# Altium schematic symbol library SCHLIB.SchLib: 2608 symbols (part 1 of 20) (continued)
## CC-5pF-0402-50V-±0.1pF (continued)
CAP CER 5PF 50V C0G/NP0 0402; Manufacturer Part Number: GCM1555C1H5R0BA16D; Manufacturer: Murata Electronics; Tolerance: ±0.1pF; Temperature Coefficient: C0G; Object  Type: Part; Design Item ID: CC-5pF-0402-50V-±0.1pF; Series: GCM; Operating Temperature: -55°C ~ 125°C; Features: -; Ratings: AEC-Q200; Applications: Automotive; Failure Rate: -; Mounting Type: Surface Mount, MLCC; Size: 1.00mm x 0.50mm; Height: -; Thickness: 0.55mm; Category: Capacitor; Value: 5pF
footprint CC0402
pins: 1, 2

## CC-5pF-0402-50V-±1%
designator C?, comment Voltage - Rated: 50V  Package: 0402  (hidden comment: 5pF)
CAP CER 5PF 50V C0G/NP0 0402; Manufacturer Part Number: GCM1555C1H5R0FA16D; Manufacturer: Murata Electronics; Tolerance: ±1%; Temperature Coefficient: C0G; Object  Type: Part; Design Item ID: CC-5pF-0402-50V-±1%; Series: GCM; Operating Temperature: -55°C ~ 125°C; Features: -; Ratings: AEC-Q200; Applications: Automotive; Failure Rate: -; Mounting Type: Surface Mount, MLCC; Size: 1.00mm x 0.50mm; Height: -; Thickness: 0.55mm; Category: Capacitor; Value: 5pF
footprint CC0402
pins: 1, 2

## CC-6.8nF-0402-50V-±10%
designator C?, comment Voltage - Rated: 50V  Package: 0402  (hidden comment: 6.8nF)
CAP CER 6800PF 50V X7R 0402; Manufacturer Part Number: GCM155R71H682KA55D; Manufacturer: Murata Electronics; Tolerance: ±10%; Temperature Coefficient: C0G; Object  Type: Part; Design Item ID: CC-6.8nF-0402-50V-±10%; Series: GCM; Operating Temperature: -55°C ~ 125°C; Features: -; Ratings: AEC-Q200; Applications: Automotive; Failure Rate: -; Mounting Type: Surface Mount, MLCC; Size: 1.00mm x 0.50mm; Height: -; Thickness: 0.55mm; Category: Capacitor; Value: 6.8nF
footprint CC0402
pins: 1, 2

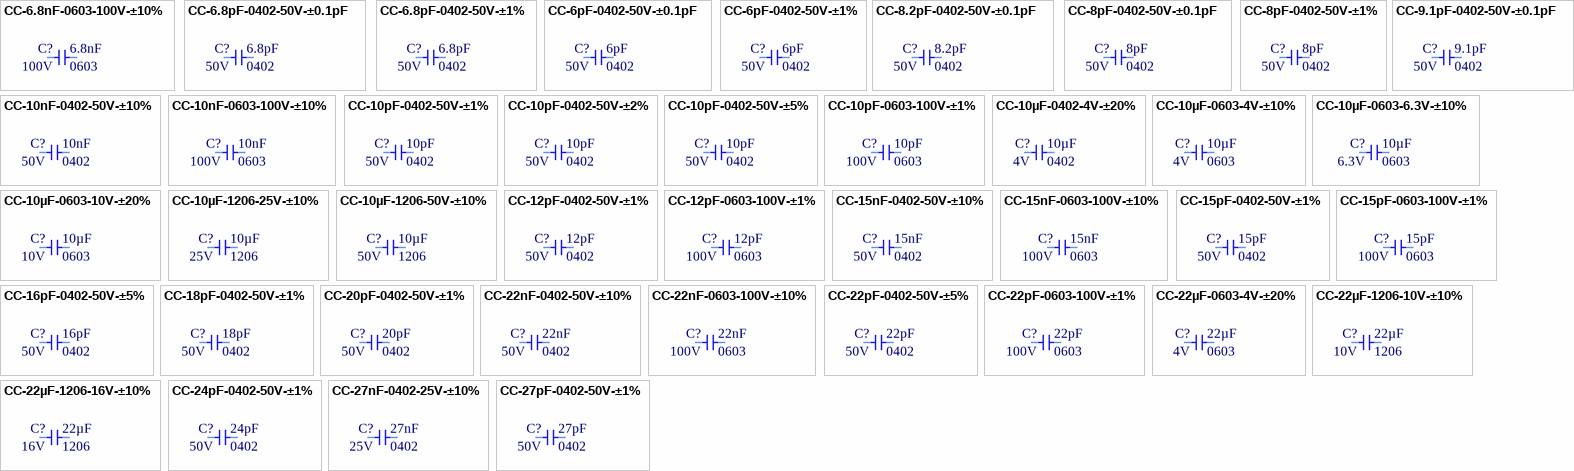
[diagram p2: symbols CC-6.8nF-0603-100V-±10% to CC-27pF-0402-50V-±1%]

## CC-6.8nF-0603-100V-±10%
designator C?, comment Voltage - Rated: 100V  Package: 0603  (hidden comment: 6.8nF)
CAP CER 6800PF 100V X7R 0603; Manufacturer Part Number: GCM188R72A682KA37D; Manufacturer: Murata Electronics; Tolerance: ±10%; Object  Type: Part; Design Item ID: CC-6.8nF-0603-100V-±10%; Series: GCM; Temperature Coefficient: X7R; Operating Temperature: -55°C ~ 125°C; Features: -; Ratings: AEC-Q200; Applications: Automotive; Failure Rate: -; Mounting Type: Surface Mount, MLCC; Size: 1.60mm x 0.80mm; Height: -; Thickness: 0.90mm; Category: Capacitor; Value: 6.8nF
footprint CC0603
pins: 1, 2

## CC-6.8pF-0402-50V-±0.1pF
designator C?, comment Voltage - Rated: 50V  Package: 0402  (hidden comment: 6.8pF)
CAP CER 6.8PF 50V C0G/NP0 0402; Manufacturer Part Number: GCM1555C1H6R8BA16D; Manufacturer: Murata Electronics; Tolerance: ±0.1pF; Temperature Coefficient: C0G; Object  Type: Part; Design Item ID: CC-6.8pF-0402-50V-±0.1pF; Series: GCM; Operating Temperature: -55°C ~ 125°C; Features: -; Ratings: AEC-Q200; Applications: Automotive; Failure Rate: -; Mounting Type: Surface Mount, MLCC; Size: 1.00mm x 0.50mm; Height: -; Thickness: 0.55mm; Category: Capacitor; Value: 6.8pF
footprint CC0402
pins: 1, 2

## CC-6.8pF-0402-50V-±1%
designator C?, comment Voltage - Rated: 50V  Package: 0402  (hidden comment: 6.8pF)
CAP CER 6.8PF 50V C0G/NP0 0402; Manufacturer Part Number: GCM1555C1H6R8FA16D; Manufacturer: Murata Electronics; Tolerance: ±1%; Temperature Coefficient: C0G; Object  Type: Part; Design Item ID: CC-6.8pF-0402-50V-±1%; Series: GCM; Operating Temperature: -55°C ~ 125°C; Features: -; Ratings: AEC-Q200; Applications: Automotive; Failure Rate: -; Mounting Type: Surface Mount, MLCC; Size: 1.00mm x 0.50mm; Height: -; Thickness: 0.55mm; Category: Capacitor; Value: 6.8pF
footprint CC0402
pins: 1, 2

## CC-6pF-0402-50V-±0.1pF
designator C?, comment Voltage - Rated: 50V  Package: 0402  (hidden comment: 6pF)
CAP CER 6PF 50V C0G/NP0 0402; Manufacturer Part Number: GCM1555C1H6R0BA16D; Manufacturer: Murata Electronics; Tolerance: ±0.1pF; Temperature Coefficient: C0G; Object  Type: Part; Design Item ID: CC-6pF-0402-50V-±0.1pF; Series: GCM; Value: 6pF; Operating Temperature: -55°C ~ 125°C; Features: -; Ratings: AEC-Q200; Applications: Automotive; Failure Rate: -; Mounting Type: Surface Mount, MLCC; Size: 1.00mm x 0.50mm; Height: -; Thickness: 0.55mm; Category: Capacitor
footprint CC0402
pins: 1, 2

## CC-6pF-0402-50V-±1%
designator C?, comment Voltage - Rated: 50V  Package: 0402  (hidden comment: 6pF)
CAP CER 6PF 50V C0G/NP0 0402; Manufacturer Part Number: GCM1555C1H6R0FA16D; Manufacturer: Murata Electronics; Tolerance: ±1%; Temperature Coefficient: C0G; Object  Type: Part; Design Item ID: CC-6pF-0402-50V-±1%; Series: GCM; Value: 6pF; Operating Temperature: -55°C ~ 125°C; Features: -; Ratings: AEC-Q200; Applications: Automotive; Failure Rate: -; Mounting Type: Surface Mount, MLCC; Size: 1.00mm x 0.50mm; Height: -; Thickness: 0.55mm; Category: Capacitor
footprint CC0402
pins: 1, 2

## CC-8.2pF-0402-50V-±0.1pF
designator C?, comment Voltage - Rated: 50V  Package: 0402  (hidden comment: 8.2pF)
CAP CER 8.2PF 50V C0G/NP0 0402; Manufacturer Part Number: GCM1555C1H8R2BA16D; Manufacturer: Murata Electronics; Tolerance: ±0.1pF; Temperature Coefficient: C0G; Object  Type: Part; Design Item ID: CC-8.2pF-0402-50V-±0.1pF; Series: GCM; Value: 8.2pF; Operating Temperature: -55°C ~ 125°C; Features: -; Ratings: AEC-Q200; Applications: Automotive; Failure Rate: -; Mounting Type: Surface Mount, MLCC; Size: 1.00mm x 0.50mm; Height: -; Thickness: 0.55mm; Category: Capacitor
footprint CC0402
pins: 1, 2

## CC-8pF-0402-50V-±0.1pF
designator C?, comment Voltage - Rated: 50V  Package: 0402  (hidden comment: 8pF)
CAP CER 8PF 50V C0G/NP0 0402; Manufacturer Part Number: GCM1555C1H8R0BA16D; Manufacturer: Murata Electronics; Tolerance: ±0.1pF; Temperature Coefficient: C0G; Object  Type: Part; Design Item ID: CC-8pF-0402-50V-±0.1pF; Series: GCM; Operating Temperature: -55°C ~ 125°C; Features: -; Ratings: AEC-Q200; Applications: Automotive; Failure Rate: -; Mounting Type: Surface Mount, MLCC; Size: 1.00mm x 0.50mm; Height: -; Thickness: 0.55mm; Category: Capacitor; Value: 8pF
footprint CC0402
pins: 1, 2

## CC-8pF-0402-50V-±1%
designator C?, comment Voltage - Rated: 50V  Package: 0402  (hidden comment: 8pF)
CAP CER 8PF 50V C0G/NP0 0402; Manufacturer Part Number: GCM1555C1H8R0FA16D; Manufacturer: Murata Electronics; Tolerance: ±1%; Temperature Coefficient: C0G; Object  Type: Part; Design Item ID: CC-8pF-0402-50V-±1%; Series: GCM; Value: 8pF; Operating Temperature: -55°C ~ 125°C; Features: -; Ratings: AEC-Q200; Applications: Automotive; Failure Rate: -; Mounting Type: Surface Mount, MLCC; Size: 1.00mm x 0.50mm; Height: -; Thickness: 0.55mm; Category: Capacitor
footprint CC0402
pins: 1, 2

## CC-9.1pF-0402-50V-±0.1pF
designator C?, comment Voltage - Rated: 50V  Package: 0402  (hidden comment: 9.1pF)
CAP CER 9.1PF 50V C0G/NP0 0402; Manufacturer Part Number: GCM1555C1H9R1BA16D; Manufacturer: Murata Electronics; Tolerance: ±0.1pF; Temperature Coefficient: C0G; Object  Type: Part; Design Item ID: CC-9.1pF-0402-50V-±0.1pF; Series: GCM; Value: 9.1pF; Operating Temperature: -55°C ~ 125°C; Features: -; Ratings: AEC-Q200; Applications: Automotive; Failure Rate: -; Mounting Type: Surface Mount, MLCC; Size: 1.00mm x 0.50mm; Height: -; Thickness: 0.55mm; Category: Capacitor
footprint CC0402
pins: 1, 2

## CC-10nF-0402-50V-±10%
designator C?, comment Voltage - Rated: 50V  Package: 0402  (hidden comment: 10nF)
CAP CER 10000PF 50V X7R 0402; Manufacturer Part Number: GCM155R71H103KA55D; Manufacturer: Murata Electronics; Tolerance: ±10%; Temperature Coefficient: C0G; Object  Type: Part; Design Item ID: CC-10nF-0402-50V-±10%; Series: GCM; Value: 10nF; Operating Temperature: -55°C ~ 125°C; Features: -; Ratings: AEC-Q200; Applications: Automotive; Failure Rate: -; Mounting Type: Surface Mount, MLCC; Size: 1.00mm x 0.50mm; Height: -; Thickness: 0.55mm; Category: Capacitor
footprint CC0402
pins: 1, 2

## CC-10nF-0603-100V-±10%
designator C?, comment Voltage - Rated: 100V  Package: 0603  (hidden comment: 10nF)
CAP CER 10000PF 100V X7R 0603; Manufacturer Part Number: GCM188R72A103KA37D; Manufacturer: Murata Electronics; Tolerance: ±10%; Object  Type: Part; Design Item ID: CC-10nF-0603-100V-±10%; Series: GCM; Temperature Coefficient: X7R; Operating Temperature: -55°C ~ 125°C; Features: -; Ratings: AEC-Q200; Applications: Automotive; Failure Rate: -; Mounting Type: Surface Mount, MLCC; Size: 1.60mm x 0.80mm; Height: -; Thickness: 0.90mm; Category: Capacitor; Value: 10nF
footprint CC0603
pins: 1, 2

## CC-10pF-0402-50V-±1%
designator C?, comment Voltage - Rated: 50V  Package: 0402  (hidden comment: 10pF)
CAP CER 10PF 50V C0G/NP0 0402; Manufacturer Part Number: GCM1555C1H100FA16D; Manufacturer: Murata Electronics; Tolerance: ±1%; Temperature Coefficient: C0G; Object  Type: Part; Design Item ID: CC-10pF-0402-50V-±1%; Series: GCM; Value: 10pF; Operating Temperature: -55°C ~ 125°C; Features: -; Ratings: AEC-Q200; Applications: Automotive; Failure Rate: -; Mounting Type: Surface Mount, MLCC; Size: 1.00mm x 0.50mm; Height: -; Thickness: 0.55mm; Category: Capacitor
footprint CC0402
pins: 1, 2

## CC-10pF-0402-50V-±2%
designator C?, comment Voltage - Rated: 50V  Package: 0402  (hidden comment: 10pF)
CAP CER 10PF 50V C0G/NP0 0402; Manufacturer Part Number: GCM1555C1H100GA16D; Manufacturer: Murata Electronics; Tolerance: ±2%; Temperature Coefficient: C0G; Object  Type: Part; Design Item ID: CC-10pF-0402-50V-±2%; Series: GCM; Value: 10pF; Operating Temperature: -55°C ~ 125°C; Features: -; Ratings: AEC-Q200; Applications: Automotive; Failure Rate: -; Mounting Type: Surface Mount, MLCC; Size: 1.00mm x 0.50mm; Height: -; Thickness: 0.55mm; Category: Capacitor
footprint CC0402
pins: 1, 2

## CC-10pF-0402-50V-±5%
designator C?, comment Voltage - Rated: 50V  Package: 0402  (hidden comment: 10pF)
CAP CER 10PF 50V C0G/NP0 0402; Manufacturer Part Number: GCM1555C1H100JA16D; Manufacturer: Murata Electronics; Tolerance: ±5%; Temperature Coefficient: C0G; Object  Type: Part; Design Item ID: CC-10pF-0402-50V-±5%; Series: GCM; Value: 10pF; Operating Temperature: -55°C ~ 125°C; Features: -; Ratings: AEC-Q200; Applications: Automotive; Failure Rate: -; Mounting Type: Surface Mount, MLCC; Size: 1.00mm x 0.50mm; Height: -; Thickness: 0.55mm; Category: Capacitor
footprint CC0402
pins: 1, 2

## CC-10pF-0603-100V-±1%
designator C?, comment Voltage - Rated: 100V  Package: 0603  (hidden comment: 10pF)
CAP CER 10PF 100V C0G/NP0 0603; Manufacturer Part Number: GCM1885C2A100FA16D; Manufacturer: Murata Electronics; Tolerance: ±1%; Temperature Coefficient: C0G; Object  Type: Part; Design Item ID: CC-10pF-0603-100V-±1%; Series: GCM; Operating Temperature: -55°C ~ 125°C; Features: -; Ratings: AEC-Q200; Applications: Automotive; Failure Rate: -; Mounting Type: Surface Mount, MLCC; Size: 1.60mm x 0.80mm; Height: -; Thickness: 0.90mm; Category: Capacitor; Value: 10pF
footprint CC0603
pins: 1, 2

## CC-10µF-0402-4V-±20%
designator C?, comment Voltage - Rated: 4V  Package: 0402  (hidden comment: 10µF)
CAP CER 10UF 4V X5R 0402; Manufacturer Part Number: AMK105CBJ106MVHF; Manufacturer: Taiyo Yuden; Tolerance: ±20%; Temperature Coefficient: C0G; Object  Type: Part; Design Item ID: CC-10µF-0402-4V-±20%; Series: M; Operating Temperature: -55°C ~ 85°C; Features: -; Ratings: AEC-Q200; Applications: Automotive; Failure Rate: -; Mounting Type: Surface Mount, MLCC; Size: 1.00mm x 0.50mm; Height: -; Thickness: 0.70mm; Category: Capacitor; Value: 10µF
footprint CC0402
pins: 1, 2

## CC-10µF-0603-4V-±10%
designator C?, comment Voltage - Rated: 4V  Package: 0603  (hidden comment: 10µF)
CAP CER 10UF 4V X5R 0603; Manufacturer Part Number: AMK107ABJ106KAHT; Manufacturer: Taiyo Yuden; Tolerance: ±10%; Object  Type: Part; Design Item ID: CC-10µF-0603-4V-±10%; Series: M; Temperature Coefficient: X5R; Operating Temperature: -55°C ~ 85°C; Features: -; Ratings: AEC-Q200; Applications: Automotive; Failure Rate: -; Mounting Type: Surface Mount, MLCC; Size: 1.60mm x 0.80mm; Height: -; Thickness: 0.95mm; Category: Capacitor; Value: 10µF
footprint CC0603
pins: 1, 2

## CC-10µF-0603-6.3V-±10%
designator C?, comment Voltage - Rated: 6.3V  Package: 0603  (hidden comment: 10µF)
CAP CER 10UF 6.3V X5R 0603; Manufacturer Part Number: JMK107ABJ106KAHT; Manufacturer: Taiyo Yuden; Tolerance: ±10%; Object  Type: Part; Design Item ID: CC-10µF-0603-6.3V-±10%; Series: M; Temperature Coefficient: X5R; Operating Temperature: -55°C ~ 85°C; Features: -; Ratings: AEC-Q200; Applications: Automotive; Failure Rate: -; Mounting Type: Surface Mount, MLCC; Size: 1.60mm x 0.80mm; Height: -; Thickness: 0.95mm; Category: Capacitor; Value: 10µF
footprint CC0603
pins: 1, 2

## CC-10µF-0603-10V-±20%
designator C?, comment Voltage - Rated: 10V  Package: 0603  (hidden comment: 10µF)
CAP CER 10UF 10V X5R 0603; Manufacturer Part Number: LMK107BBJ106MAHT; Manufacturer: Taiyo Yuden; Tolerance: ±20%; Object  Type: Part; Design Item ID: CC-10µF-0603-10V-±20%; Series: M; Temperature Coefficient: X5R; Operating Temperature: -55°C ~ 85°C; Features: -; Ratings: AEC-Q200; Applications: Automotive; Failure Rate: -; Mounting Type: Surface Mount, MLCC; Size: 1.60mm x 0.80mm; Height: -; Thickness: 0.90mm; Category: Capacitor; Value: 10µF
footprint CC0603
pins: 1, 2

## CC-10µF-1206-25V-±10%
designator C?, comment Voltage - Rated: 25V  Package: 1206  (hidden comment: 10µF)
CAP CER 10UF 25V X7S 1206; Manufacturer Part Number: GCM31CC71E106KA03K; Manufacturer: Murata Electronics; Tolerance: ±10%; Object  Type: Part; Design Item ID: CC-10µF-1206-25V-±10%; Series: GCM; Temperature Coefficient: X7S; Operating Temperature: -55°C ~ 125°C; Features: -; Ratings: AEC-Q200; Applications: Automotive; Failure Rate: -; Mounting Type: Surface Mount, MLCC; Size: 3.20mm x 1.60mm; Height: -; Thickness: 1.90mm; Category: Capacitor; Value: 10µF
footprint CC1206
pins: 1, 2

## CC-10µF-1206-50V-±10%
designator C?, comment Voltage - Rated: 50V  Package: 1206  (hidden comment: 10µF)
CAP CER 10UF 50V X7R 1206; Manufacturer Part Number: CGA5L1X7R1H106K160AE; Manufacturer: TDK Corporation; Tolerance: ±10%; Object  Type: Part; Design Item ID: CC-10µF-1206-50V-±10%; Series: CGA; Temperature Coefficient: X7R; Operating Temperature: -55°C ~ 125°C; Features: Soft Termination; Ratings: AEC-Q200; Applications: Automotive, Boardflex Sensitive; Failure Rate: -; Mounting Type: Surface Mount, MLCC; Size: 3.20mm x 1.60mm; Height: -; Thickness: 1.90mm; Category: Capacitor; Value: 10µF
footprint CC1206
pins: 1, 2

## CC-12pF-0402-50V-±1%
designator C?, comment Voltage - Rated: 50V  Package: 0402  (hidden comment: 12pF)
CAP CER 12PF 50V C0G/NP0 0402; Manufacturer Part Number: GCM1555C1H120FA16J; Manufacturer: Murata Electronics; Tolerance: ±1%; Temperature Coefficient: C0G; Object  Type: Part; Design Item ID: CC-12pF-0402-50V-±1%; Series: GCM; Operating Temperature: -55°C ~ 125°C; Features: -; Ratings: AEC-Q200; Applications: Automotive; Failure Rate: -; Mounting Type: Surface Mount, MLCC; Size: 1.00mm x 0.50mm; Height: -; Thickness: 0.55mm; Category: Capacitor; Value: 12pF
footprint CC0402
pins: 1, 2

## CC-12pF-0603-100V-±1%
designator C?, comment Voltage - Rated: 100V  Package: 0603  (hidden comment: 12pF)
CAP CER 12PF 100V C0G/NP0 0603; Manufacturer Part Number: GCM1885C2A120FA16D; Manufacturer: Murata Electronics; Tolerance: ±1%; Temperature Coefficient: C0G; Object  Type: Part; Design Item ID: CC-12pF-0603-100V-±1%; Series: GCM; Operating Temperature: -55°C ~ 125°C; Features: -; Ratings: AEC-Q200; Applications: Automotive; Failure Rate: -; Mounting Type: Surface Mount, MLCC; Size: 1.60mm x 0.80mm; Height: -; Thickness: 0.90mm; Category: Capacitor; Value: 12pF
footprint CC0603
pins: 1, 2

## CC-15nF-0402-50V-±10%
designator C?, comment Voltage - Rated: 50V  Package: 0402  (hidden comment: 15nF)
CAP CER 0.015UF 50V X7R 0402; Manufacturer Part Number: GCM155R71H153KA55D; Manufacturer: Murata Electronics; Tolerance: ±10%; Temperature Coefficient: C0G; Object  Type: Part; Design Item ID: CC-15nF-0402-50V-±10%; Series: GCM; Operating Temperature: -55°C ~ 125°C; Features: -; Ratings: AEC-Q200; Applications: Automotive; Failure Rate: -; Mounting Type: Surface Mount, MLCC; Size: 1.00mm x 0.50mm; Height: -; Thickness: 0.55mm; Category: Capacitor; Value: 15nF
footprint CC0402
pins: 1, 2

## CC-15nF-0603-100V-±10%
designator C?, comment Voltage - Rated: 100V  Package: 0603  (hidden comment: 15nF)
CAP CER 0.015UF 100V X7R 0603; Manufacturer Part Number: GCM188R72A153KA37D; Manufacturer: Murata Electronics; Tolerance: ±10%; Object  Type: Part; Design Item ID: CC-15nF-0603-100V-±10%; Series: GCM; Temperature Coefficient: X7R; Operating Temperature: -55°C ~ 125°C; Features: -; Ratings: AEC-Q200; Applications: Automotive; Failure Rate: -; Mounting Type: Surface Mount, MLCC; Size: 1.60mm x 0.80mm; Height: -; Thickness: 0.90mm; Category: Capacitor; Value: 15nF
footprint CC0603
pins: 1, 2

## CC-15pF-0402-50V-±1%
designator C?, comment Voltage - Rated: 50V  Package: 0402  (hidden comment: 15pF)
CAP CER 15PF 50V C0G/NP0 0402; Manufacturer Part Number: GCM1555C1H150FA16J; Manufacturer: Murata Electronics; Tolerance: ±1%; Temperature Coefficient: C0G; Object  Type: Part; Design Item ID: CC-15pF-0402-50V-±1%; Series: GCM; Operating Temperature: -55°C ~ 125°C; Features: -; Ratings: AEC-Q200; Applications: Automotive; Failure Rate: -; Mounting Type: Surface Mount, MLCC; Size: 1.00mm x 0.50mm; Height: -; Thickness: 0.55mm; Category: Capacitor; Value: 15pF
footprint CC0402
pins: 1, 2

## CC-15pF-0603-100V-±1%
designator C?, comment Voltage - Rated: 100V  Package: 0603  (hidden comment: 15pF)
CAP CER 15PF 100V C0G/NP0 0603; Manufacturer Part Number: GCM1885C2A150FA16D; Manufacturer: Murata Electronics; Tolerance: ±1%; Temperature Coefficient: C0G; Object  Type: Part; Design Item ID: CC-15pF-0603-100V-±1%; Series: GCM; Operating Temperature: -55°C ~ 125°C; Features: -; Ratings: AEC-Q200; Applications: Automotive; Failure Rate: -; Mounting Type: Surface Mount, MLCC; Size: 1.60mm x 0.80mm; Height: -; Thickness: 0.90mm; Category: Capacitor; Value: 15pF
footprint CC0603
pins: 1, 2

## CC-16pF-0402-50V-±5%
designator C?, comment Voltage - Rated: 50V  Package: 0402  (hidden comment: 16pF)
CAP CER 16PF 50V NP0 0402; Manufacturer Part Number: GCM1555C1H160JA16D; Manufacturer: Murata Electronics; Tolerance: ±5%; Temperature Coefficient: C0G; Object  Type: Part; Design Item ID: CC-16pF-0402-50V-±5%; Series: GCM; Operating Temperature: -55°C ~ 125°C; Features: -; Ratings: AEC-Q200; Applications: Automotive; Failure Rate: -; Mounting Type: Surface Mount, MLCC; Size: 1.00mm x 0.50mm; Height: -; Thickness: 0.55mm; Category: Capacitor; Value: 16pF
footprint CC0402
pins: 1, 2

## CC-18pF-0402-50V-±1%
designator C?, comment Voltage - Rated: 50V  Package: 0402  (hidden comment: 18pF)
CAP CER 18PF 50V C0G/NP0 0402; Manufacturer Part Number: GCM1555C1H180FA16J; Manufacturer: Murata Electronics; Tolerance: ±1%; Temperature Coefficient: C0G; Object  Type: Part; Design Item ID: CC-18pF-0402-50V-±1%; Series: GCM; Operating Temperature: -55°C ~ 125°C; Features: -; Ratings: AEC-Q200; Applications: Automotive; Failure Rate: -; Mounting Type: Surface Mount, MLCC; Size: 1.00mm x 0.50mm; Height: -; Thickness: 0.55mm; Category: Capacitor; Value: 18pF
footprint CC0402
pins: 1, 2

## CC-20pF-0402-50V-±1%
designator C?, comment Voltage - Rated: 50V  Package: 0402  (hidden comment: 20pF)
CAP CER 20PF 50V C0G/NP0 0402; Manufacturer Part Number: GCM1555C1H200FA16D; Manufacturer: Murata Electronics; Tolerance: ±1%; Temperature Coefficient: C0G; Object  Type: Part; Design Item ID: CC-20pF-0402-50V-±1%; Series: GCM; Operating Temperature: -55°C ~ 125°C; Features: -; Ratings: AEC-Q200; Applications: Automotive; Failure Rate: -; Mounting Type: Surface Mount, MLCC; Size: 1.00mm x 0.50mm; Height: -; Thickness: 0.55mm; Category: Capacitor; Value: 20pF
footprint CC0402
pins: 1, 2

## CC-22nF-0402-50V-±10%
designator C?, comment Voltage - Rated: 50V  Package: 0402  (hidden comment: 22nF)
CAP CER 0.022UF 50V X7R 0402; Manufacturer Part Number: GCM155R71H223KA55D; Manufacturer: Murata Electronics; Tolerance: ±10%; Temperature Coefficient: C0G; Object  Type: Part; Design Item ID: CC-22nF-0402-50V-±10%; Series: GCM; Operating Temperature: -55°C ~ 125°C; Features: -; Ratings: AEC-Q200; Applications: Automotive; Failure Rate: -; Mounting Type: Surface Mount, MLCC; Size: 1.00mm x 0.50mm; Height: -; Thickness: 0.55mm; Category: Capacitor; Value: 22nF
footprint CC0402
pins: 1, 2

## CC-22nF-0603-100V-±10%
designator C?, comment Voltage - Rated: 100V  Package: 0603  (hidden comment: 22nF)
CAP CER 0.022UF 100V X7R 0603; Manufacturer Part Number: GCM188R72A223KA37D; Manufacturer: Murata Electronics; Tolerance: ±10%; Object  Type: Part; Design Item ID: CC-22nF-0603-100V-±10%; Series: GCM; Temperature Coefficient: X7R; Operating Temperature: -55°C ~ 125°C; Features: -; Ratings: AEC-Q200; Applications: Automotive; Failure Rate: -; Mounting Type: Surface Mount, MLCC; Size: 1.60mm x 0.80mm; Height: -; Thickness: 0.90mm; Category: Capacitor; Value: 22nF
footprint CC0603
pins: 1, 2

## CC-22pF-0402-50V-±5%
designator C?, comment Voltage - Rated: 50V  Package: 0402  (hidden comment: 22pF)
CAP CER 22PF 50V NP0 0402; Manufacturer Part Number: GCM1555C1H220JA16J; Manufacturer: Murata Electronics; Tolerance: ±5%; Temperature Coefficient: C0G; Object  Type: Part; Design Item ID: CC-22pF-0402-50V-±5%; Series: GCM; Operating Temperature: -55°C ~ 125°C; Features: -; Ratings: AEC-Q200; Applications: Automotive; Failure Rate: -; Mounting Type: Surface Mount, MLCC; Size: 1.00mm x 0.50mm; Height: -; Thickness: 0.55mm; Category: Capacitor; Value: 22pF
footprint CC0402
pins: 1, 2

## CC-22pF-0603-100V-±1%
designator C?, comment Voltage - Rated: 100V  Package: 0603  (hidden comment: 22pF)
CAP CER 22PF 100V C0G/NP0 0603; Manufacturer Part Number: GCM1885C2A220FA16D; Manufacturer: Murata Electronics; Tolerance: ±1%; Temperature Coefficient: C0G; Object  Type: Part; Design Item ID: CC-22pF-0603-100V-±1%; Series: GCM; Operating Temperature: -55°C ~ 125°C; Features: -; Ratings: AEC-Q200; Applications: Automotive; Failure Rate: -; Mounting Type: Surface Mount, MLCC; Size: 1.60mm x 0.80mm; Height: -; Thickness: 0.90mm; Category: Capacitor; Value: 22pF
footprint CC0603
pins: 1, 2

## CC-22µF-0603-4V-±20%
designator C?, comment Voltage - Rated: 4V  Package: 0603  (hidden comment: 22µF)
CAP CER 22UF 4V X5R 0603; Manufacturer Part Number: AMK107BBJ226MAHT; Manufacturer: Taiyo Yuden; Tolerance: ±20%; Object  Type: Part; Design Item ID: CC-22µF-0603-4V-±20%; Series: M; Temperature Coefficient: X5R; Operating Temperature: -55°C ~ 85°C; Features: -; Ratings: AEC-Q200; Applications: Automotive; Failure Rate: -; Mounting Type: Surface Mount, MLCC; Size: 1.60mm x 0.80mm; Height: -; Thickness: 0.90mm; Category: Capacitor; Value: 22µF
footprint CC0603
pins: 1, 2

## CC-22µF-1206-10V-±10%
designator C?, comment Voltage - Rated: 10V  Package: 1206  (hidden comment: 22µF)
CAP CER 22UF 10V X7R 1206; Manufacturer Part Number: GCM31CR71A226KE02L; Manufacturer: Murata Electronics; Tolerance: ±10%; Object  Type: Part; Design Item ID: CC-22µF-1206-10V-±10%; Series: GCM; Temperature Coefficient: X7R; Operating Temperature: -55°C ~ 125°C; Features: -; Ratings: AEC-Q200; Applications: Automotive; Failure Rate: -; Mounting Type: Surface Mount, MLCC; Size: 3.20mm x 1.60mm; Height: -; Thickness: 1.80mm; Category: Capacitor; Value: 22µF
footprint CC1206
pins: 1, 2

## CC-22µF-1206-16V-±10%
designator C?, comment Voltage - Rated: 16V  Package: 1206  (hidden comment: 22µF)
CAP CER 22UF 16V X6S 1206; Manufacturer Part Number: GRT31CC81C226KE01L; Manufacturer: Murata Electronics; Tolerance: ±10%; Object  Type: Part; Design Item ID: CC-22µF-1206-16V-±10%; Series: GRT; Temperature Coefficient: X6S; Operating Temperature: -55°C ~ 105°C; Features: -; Ratings: AEC-Q200; Applications: Automotive; Failure Rate: -; Mounting Type: Surface Mount, MLCC; Size: 3.20mm x 1.60mm; Height: -; Thickness: 1.80mm; Category: Capacitor; Value: 22µF
footprint CC1206
pins: 1, 2

## CC-24pF-0402-50V-±1%
designator C?, comment Voltage - Rated: 50V  Package: 0402  (hidden comment: 24pF)
CAP CER 24PF 50V C0G/NP0 0402; Manufacturer Part Number: GCM1555C1H240FA16D; Manufacturer: Murata Electronics; Tolerance: ±1%; Temperature Coefficient: C0G; Object  Type: Part; Design Item ID: CC-24pF-0402-50V-±1%; Series: GCM; Operating Temperature: -55°C ~ 125°C; Features: -; Ratings: AEC-Q200; Applications: Automotive; Failure Rate: -; Mounting Type: Surface Mount, MLCC; Size: 1.00mm x 0.50mm; Height: -; Thickness: 0.55mm; Category: Capacitor; Value: 24pF
footprint CC0402
pins: 1, 2

## CC-27nF-0402-25V-±10%
designator C?, comment Voltage - Rated: 25V  Package: 0402  (hidden comment: 27nF)
CAP CER 0.027UF 25V X7R 0402; Manufacturer Part Number: GCM155R71E273KA55D; Manufacturer: Murata Electronics; Tolerance: ±10%; Temperature Coefficient: C0G; Object  Type: Part; Design Item ID: CC-27nF-0402-25V-±10%; Series: GCM; Operating Temperature: -55°C ~ 125°C; Features: -; Ratings: AEC-Q200; Applications: Automotive; Failure Rate: -; Mounting Type: Surface Mount, MLCC; Size: 1.00mm x 0.50mm; Height: -; Thickness: 0.55mm; Category: Capacitor; Value: 27nF
footprint CC0402
pins: 1, 2

## CC-27pF-0402-50V-±1%
designator C?, comment Voltage - Rated: 50V  Package: 0402  (hidden comment: 27pF)
CAP CER 27PF 50V C0G/NP0 0402; Manufacturer Part Number: GCM1555C1H270FA16J; Manufacturer: Murata Electronics; Tolerance: ±1%; Temperature Coefficient: C0G; Object  Type: Part; Design Item ID: CC-27pF-0402-50V-±1%; Series: GCM; Operating Temperature: -55°C ~ 125°C; Features: -; Ratings: AEC-Q200; Applications: Automotive; Failure Rate: -; Mounting Type: Surface Mount, MLCC; Size: 1.00mm x 0.50mm; Height: -; Thickness: 0.55mm; Category: Capacitor; Value: 27pF
footprint CC0402
pins: 1, 2

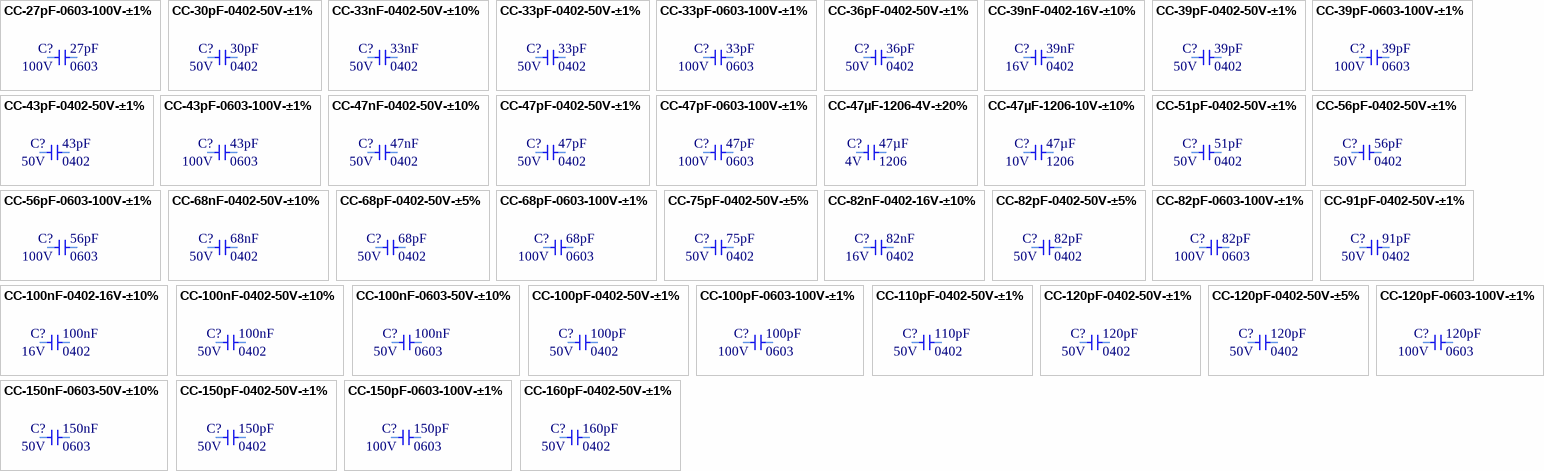
[diagram p3: symbols CC-27pF-0603-100V-±1% to CC-160pF-0402-50V-±1%]

## CC-27pF-0603-100V-±1%
designator C?, comment Voltage - Rated: 100V  Package: 0603  (hidden comment: 27pF)
CAP CER 27PF 100V C0G/NP0 0603; Manufacturer Part Number: GCM1885C2A270FA16D; Manufacturer: Murata Electronics; Tolerance: ±1%; Temperature Coefficient: C0G; Object  Type: Part; Design Item ID: CC-27pF-0603-100V-±1%; Series: GCM; Operating Temperature: -55°C ~ 125°C; Features: -; Ratings: AEC-Q200; Applications: Automotive; Failure Rate: -; Mounting Type: Surface Mount, MLCC; Size: 1.60mm x 0.80mm; Height: -; Thickness: 0.90mm; Category: Capacitor; Value: 27pF
footprint CC0603
pins: 1, 2

## CC-30pF-0402-50V-±1%
designator C?, comment Voltage - Rated: 50V  Package: 0402  (hidden comment: 30pF)
CAP CER 30PF 50V C0G/NP0 0402; Manufacturer Part Number: GCM1555C1H300FA16D; Manufacturer: Murata Electronics; Tolerance: ±1%; Temperature Coefficient: C0G; Object  Type: Part; Design Item ID: CC-30pF-0402-50V-±1%; Series: GCM; Operating Temperature: -55°C ~ 125°C; Features: -; Ratings: AEC-Q200; Applications: Automotive; Failure Rate: -; Mounting Type: Surface Mount, MLCC; Size: 1.00mm x 0.50mm; Height: -; Thickness: 0.55mm; Category: Capacitor; Value: 30pF
footprint CC0402
pins: 1, 2

## CC-33nF-0402-50V-±10%
designator C?, comment Voltage - Rated: 50V  Package: 0402  (hidden comment: 33nF)
CAP CER 0.033UF 50V X7R 0402; Manufacturer Part Number: GCM155R71H333KE02D; Manufacturer: Murata Electronics; Tolerance: ±10%; Temperature Coefficient: C0G; Object  Type: Part; Design Item ID: CC-33nF-0402-50V-±10%; Series: GCM; Operating Temperature: -55°C ~ 125°C; Features: -; Ratings: AEC-Q200; Applications: Automotive; Failure Rate: -; Mounting Type: Surface Mount, MLCC; Size: 1.00mm x 0.50mm; Height: -; Thickness: 0.55mm; Category: Capacitor; Value: 33nF
footprint CC0402
pins: 1, 2

## CC-33pF-0402-50V-±1%
designator C?, comment Voltage - Rated: 50V  Package: 0402  (hidden comment: 33pF)
CAP CER 33PF 50V C0G/NP0 0402; Manufacturer Part Number: GCM1555C1H330FA16J; Manufacturer: Murata Electronics; Tolerance: ±1%; Temperature Coefficient: C0G; Object  Type: Part; Design Item ID: CC-33pF-0402-50V-±1%; Series: GCM; Operating Temperature: -55°C ~ 125°C; Features: -; Ratings: AEC-Q200; Applications: Automotive; Failure Rate: -; Mounting Type: Surface Mount, MLCC; Size: 1.00mm x 0.50mm; Height: -; Thickness: 0.55mm; Category: Capacitor; Value: 33pF
footprint CC0402
pins: 1, 2

## CC-33pF-0603-100V-±1%
designator C?, comment Voltage - Rated: 100V  Package: 0603  (hidden comment: 33pF)
CAP CER 33PF 100V C0G/NP0 0603; Manufacturer Part Number: GCM1885C2A330FA16D; Manufacturer: Murata Electronics; Tolerance: ±1%; Temperature Coefficient: C0G; Object  Type: Part; Design Item ID: CC-33pF-0603-100V-±1%; Series: GCM; Operating Temperature: -55°C ~ 125°C; Features: -; Ratings: AEC-Q200; Applications: Automotive; Failure Rate: -; Mounting Type: Surface Mount, MLCC; Size: 1.60mm x 0.80mm; Height: -; Thickness: 0.90mm; Category: Capacitor; Value: 33pF
footprint CC0603
pins: 1, 2

## CC-36pF-0402-50V-±1%
designator C?, comment Voltage - Rated: 50V  Package: 0402  (hidden comment: 36pF)
CAP CER 36PF 50V C0G/NP0 0402; Manufacturer Part Number: GCM1555C1H360FA16D; Manufacturer: Murata Electronics; Tolerance: ±1%; Temperature Coefficient: C0G; Object  Type: Part; Design Item ID: CC-36pF-0402-50V-±1%; Series: GCM; Operating Temperature: -55°C ~ 125°C; Features: -; Ratings: AEC-Q200; Applications: Automotive; Failure Rate: -; Mounting Type: Surface Mount, MLCC; Size: 1.00mm x 0.50mm; Height: -; Thickness: 0.55mm; Category: Capacitor; Value: 36pF
footprint CC0402
pins: 1, 2

## CC-39nF-0402-16V-±10%
designator C?, comment Voltage - Rated: 16V  Package: 0402  (hidden comment: 39nF)
CAP CER 0.039UF 16V X7R 0402; Manufacturer Part Number: GCM155R71C393KA37D; Manufacturer: Murata Electronics; Tolerance: ±10%; Temperature Coefficient: C0G; Object  Type: Part; Design Item ID: CC-39nF-0402-16V-±10%; Series: GCM; Operating Temperature: -55°C ~ 125°C; Features: -; Ratings: AEC-Q200; Applications: Automotive; Failure Rate: -; Mounting Type: Surface Mount, MLCC; Size: 1.00mm x 0.50mm; Height: -; Thickness: 0.55mm; Category: Capacitor; Value: 39nF
footprint CC0402
pins: 1, 2

## CC-39pF-0402-50V-±1%
designator C?, comment Voltage - Rated: 50V  Package: 0402  (hidden comment: 39pF)
CAP CER 39PF 50V C0G/NP0 0402; Manufacturer Part Number: GCM1555C1H390FA16D; Manufacturer: Murata Electronics; Tolerance: ±1%; Temperature Coefficient: C0G; Object  Type: Part; Design Item ID: CC-39pF-0402-50V-±1%; Series: GCM; Operating Temperature: -55°C ~ 125°C; Features: -; Ratings: AEC-Q200; Applications: Automotive; Failure Rate: -; Mounting Type: Surface Mount, MLCC; Size: 1.00mm x 0.50mm; Height: -; Thickness: 0.55mm; Category: Capacitor; Value: 39pF
footprint CC0402
pins: 1, 2

## CC-39pF-0603-100V-±1%
designator C?, comment Voltage - Rated: 100V  Package: 0603  (hidden comment: 39pF)
CAP CER 39PF 100V C0G/NP0 0603; Manufacturer Part Number: GCM1885C2A390FA16D; Manufacturer: Murata Electronics; Tolerance: ±1%; Temperature Coefficient: C0G; Object  Type: Part; Design Item ID: CC-39pF-0603-100V-±1%; Series: GCM; Operating Temperature: -55°C ~ 125°C; Features: -; Ratings: AEC-Q200; Applications: Automotive; Failure Rate: -; Mounting Type: Surface Mount, MLCC; Size: 1.60mm x 0.80mm; Height: -; Thickness: 0.90mm; Category: Capacitor; Value: 39pF
footprint CC0603
pins: 1, 2

## CC-43pF-0402-50V-±1%
designator C?, comment Voltage - Rated: 50V  Package: 0402  (hidden comment: 43pF)
CAP CER 43PF 50V C0G/NP0 0402; Manufacturer Part Number: GCM1555C1H430FA16D; Manufacturer: Murata Electronics; Tolerance: ±1%; Temperature Coefficient: C0G; Object  Type: Part; Design Item ID: CC-43pF-0402-50V-±1%; Series: GCM; Operating Temperature: -55°C ~ 125°C; Features: -; Ratings: AEC-Q200; Applications: Automotive; Failure Rate: -; Mounting Type: Surface Mount, MLCC; Size: 1.00mm x 0.50mm; Height: -; Thickness: 0.55mm; Category: Capacitor; Value: 43pF
footprint CC0402
pins: 1, 2

## CC-43pF-0603-100V-±1%
designator C?, comment Voltage - Rated: 100V  Package: 0603  (hidden comment: 43pF)
CAP CER 43PF 100V C0G/NP0 0603; Manufacturer Part Number: GCM1885C2A430FA16D; Manufacturer: Murata Electronics; Tolerance: ±1%; Temperature Coefficient: C0G; Object  Type: Part; Design Item ID: CC-43pF-0603-100V-±1%; Series: GCM; Operating Temperature: -55°C ~ 125°C; Features: -; Ratings: AEC-Q200; Applications: Automotive; Failure Rate: -; Mounting Type: Surface Mount, MLCC; Size: 1.60mm x 0.80mm; Height: -; Thickness: 0.90mm; Category: Capacitor; Value: 43pF
footprint CC0603
pins: 1, 2

## CC-47nF-0402-50V-±10%
designator C?, comment Voltage - Rated: 50V  Package: 0402  (hidden comment: 47nF)
CAP CER 0.047UF 50V X7R 0402; Manufacturer Part Number: GCM155R71H473KE02J; Manufacturer: Murata Electronics; Tolerance: ±10%; Temperature Coefficient: C0G; Object  Type: Part; Design Item ID: CC-47nF-0402-50V-±10%; Series: GCM; Operating Temperature: -55°C ~ 125°C; Features: -; Ratings: AEC-Q200; Applications: Automotive; Failure Rate: -; Mounting Type: Surface Mount, MLCC; Size: 1.00mm x 0.50mm; Height: -; Thickness: 0.55mm; Category: Capacitor; Value: 47nF
footprint CC0402
pins: 1, 2

## CC-47pF-0402-50V-±1%
designator C?, comment Voltage - Rated: 50V  Package: 0402  (hidden comment: 47pF)
CAP CER 47PF 50V C0G/NP0 0402; Manufacturer Part Number: GCM1555C1H470FA16D; Manufacturer: Murata Electronics; Tolerance: ±1%; Temperature Coefficient: C0G; Object  Type: Part; Design Item ID: CC-47pF-0402-50V-±1%; Series: GCM; Operating Temperature: -55°C ~ 125°C; Features: -; Ratings: AEC-Q200; Applications: Automotive; Failure Rate: -; Mounting Type: Surface Mount, MLCC; Size: 1.00mm x 0.50mm; Height: -; Thickness: 0.55mm; Category: Capacitor; Value: 47pF
footprint CC0402
pins: 1, 2

## CC-47pF-0603-100V-±1%
designator C?, comment Voltage - Rated: 100V  Package: 0603  (hidden comment: 47pF)
CAP CER 47PF 100V C0G/NP0 0603; Manufacturer Part Number: GCM1885C2A470FA16D; Manufacturer: Murata Electronics; Tolerance: ±1%; Temperature Coefficient: C0G; Object  Type: Part; Design Item ID: CC-47pF-0603-100V-±1%; Series: GCM; Operating Temperature: -55°C ~ 125°C; Features: -; Ratings: AEC-Q200; Applications: Automotive; Failure Rate: -; Mounting Type: Surface Mount, MLCC; Size: 1.60mm x 0.80mm; Height: -; Thickness: 0.90mm; Category: Capacitor; Value: 47pF
footprint CC0603
pins: 1, 2

## CC-47µF-1206-4V-±20%
designator C?, comment Voltage - Rated: 4V  Package: 1206  (hidden comment: 47µF)
CAP CER 47UF 4V X7T 1206; Manufacturer Part Number: GCM31CD70G476ME02L; Manufacturer: Murata Electronics; Tolerance: ±20%; Object  Type: Part; Design Item ID: CC-47µF-1206-4V-±20%; Series: GCM; Temperature Coefficient: X7T; Operating Temperature: -55°C ~ 125°C; Features: -; Ratings: AEC-Q200; Applications: Automotive; Failure Rate: -; Mounting Type: Surface Mount, MLCC; Size: 3.20mm x 1.60mm; Height: -; Thickness: 1.80mm; Category: Capacitor; Value: 47µF
footprint CC1206
pins: 1, 2

## CC-47µF-1206-10V-±10%
designator C?, comment Voltage - Rated: 10V  Package: 1206  (hidden comment: 47µF)
CAP CER 47UF 10V X5R 1206; Manufacturer Part Number: GRT31CR61A476KE13L; Manufacturer: Murata Electronics; Tolerance: ±10%; Object  Type: Part; Design Item ID: CC-47µF-1206-10V-±10%; Series: GRT; Temperature Coefficient: X5R; Operating Temperature: -55°C ~ 85°C; Features: -; Ratings: AEC-Q200; Applications: Automotive; Failure Rate: -; Mounting Type: Surface Mount, MLCC; Size: 3.20mm x 1.60mm; Height: -; Thickness: 1.80mm; Category: Capacitor; Value: 47µF
footprint CC1206
pins: 1, 2

## CC-51pF-0402-50V-±1%
designator C?, comment Voltage - Rated: 50V  Package: 0402  (hidden comment: 51pF)
CAP CER 51PF 50V C0G/NP0 0402; Manufacturer Part Number: GCM1555C1H510FA16D; Manufacturer: Murata Electronics; Tolerance: ±1%; Temperature Coefficient: C0G; Object  Type: Part; Design Item ID: CC-51pF-0402-50V-±1%; Series: GCM; Operating Temperature: -55°C ~ 125°C; Features: -; Ratings: AEC-Q200; Applications: Automotive; Failure Rate: -; Mounting Type: Surface Mount, MLCC; Size: 1.00mm x 0.50mm; Height: -; Thickness: 0.55mm; Category: Capacitor; Value: 51pF
footprint CC0402
pins: 1, 2

## CC-56pF-0402-50V-±1%
designator C?, comment Voltage - Rated: 50V  Package: 0402  (hidden comment: 56pF)
CAP CER 56PF 50V C0G/NP0 0402; Manufacturer Part Number: GCM1555C1H560FA16D; Manufacturer: Murata Electronics; Tolerance: ±1%; Temperature Coefficient: C0G; Object  Type: Part; Design Item ID: CC-56pF-0402-50V-±1%; Series: GCM; Operating Temperature: -55°C ~ 125°C; Features: -; Ratings: AEC-Q200; Applications: Automotive; Failure Rate: -; Mounting Type: Surface Mount, MLCC; Size: 1.00mm x 0.50mm; Height: -; Thickness: 0.55mm; Category: Capacitor; Value: 56pF
footprint CC0402
pins: 1, 2

## CC-56pF-0603-100V-±1%
designator C?, comment Voltage - Rated: 100V  Package: 0603  (hidden comment: 56pF)
CAP CER 56PF 100V C0G/NP0 0603; Manufacturer Part Number: GCM1885C2A560FA16D; Manufacturer: Murata Electronics; Tolerance: ±1%; Temperature Coefficient: C0G; Object  Type: Part; Design Item ID: CC-56pF-0603-100V-±1%; Series: GCM; Operating Temperature: -55°C ~ 125°C; Features: -; Ratings: AEC-Q200; Applications: Automotive; Failure Rate: -; Mounting Type: Surface Mount, MLCC; Size: 1.60mm x 0.80mm; Height: -; Thickness: 0.90mm; Category: Capacitor; Value: 56pF
footprint CC0603
pins: 1, 2

## CC-68nF-0402-50V-±10%
designator C?, comment Voltage - Rated: 50V  Package: 0402  (hidden comment: 68nF)
CAP CER 0.068UF 50V X7R 0402; Manufacturer Part Number: GCM155R71H683KE02D; Manufacturer: Murata Electronics; Tolerance: ±10%; Temperature Coefficient: C0G; Object  Type: Part; Design Item ID: CC-68nF-0402-50V-±10%; Series: GCM; Operating Temperature: -55°C ~ 125°C; Features: -; Ratings: AEC-Q200; Applications: Automotive; Failure Rate: -; Mounting Type: Surface Mount, MLCC; Size: 1.00mm x 0.50mm; Height: -; Thickness: 0.55mm; Category: Capacitor; Value: 68nF
footprint CC0402
pins: 1, 2

## CC-68pF-0402-50V-±5%
designator C?, comment Voltage - Rated: 50V  Package: 0402  (hidden comment: 68pF)
CAP CER 68PF 50V C0G/NP0 0402; Manufacturer Part Number: GCM1555C1H680JA16D; Manufacturer: Murata Electronics; Tolerance: ±5%; Temperature Coefficient: C0G; Object  Type: Part; Design Item ID: CC-68pF-0402-50V-±5%; Series: GCM; Operating Temperature: -55°C ~ 125°C; Features: -; Ratings: AEC-Q200; Applications: Automotive; Failure Rate: -; Mounting Type: Surface Mount, MLCC; Size: 1.00mm x 0.50mm; Height: -; Thickness: 0.55mm; Category: Capacitor; Value: 68pF
footprint CC0402
pins: 1, 2

## CC-68pF-0603-100V-±1%
designator C?, comment Voltage - Rated: 100V  Package: 0603  (hidden comment: 68pF)
CAP CER 68PF 100V C0G/NP0 0603; Manufacturer Part Number: GCM1885C2A680FA16D; Manufacturer: Murata Electronics; Tolerance: ±1%; Temperature Coefficient: C0G; Object  Type: Part; Design Item ID: CC-68pF-0603-100V-±1%; Series: GCM; Operating Temperature: -55°C ~ 125°C; Features: -; Ratings: AEC-Q200; Applications: Automotive; Failure Rate: -; Mounting Type: Surface Mount, MLCC; Size: 1.60mm x 0.80mm; Height: -; Thickness: 0.90mm; Category: Capacitor; Value: 68pF
footprint CC0603
pins: 1, 2

## CC-75pF-0402-50V-±5%
designator C?, comment Voltage - Rated: 50V  Package: 0402  (hidden comment: 75pF)
CAP CER 75PF 50V NP0 0402; Manufacturer Part Number: GCM1555C1H750JA16D; Manufacturer: Murata Electronics; Tolerance: ±5%; Temperature Coefficient: C0G; Object  Type: Part; Design Item ID: CC-75pF-0402-50V-±5%; Series: GCM; Operating Temperature: -55°C ~ 125°C; Features: -; Ratings: AEC-Q200; Applications: Automotive; Failure Rate: -; Mounting Type: Surface Mount, MLCC; Size: 1.00mm x 0.50mm; Height: -; Thickness: 0.55mm; Category: Capacitor; Value: 75pF
footprint CC0402
pins: 1, 2

## CC-82nF-0402-16V-±10%
designator C?, comment Voltage - Rated: 16V  Package: 0402  (hidden comment: 82nF)
CAP CER 0.082UF 16V X7R 0402; Manufacturer Part Number: GCM155R71C823KA55D; Manufacturer: Murata Electronics; Tolerance: ±10%; Temperature Coefficient: C0G; Object  Type: Part; Design Item ID: CC-82nF-0402-16V-±10%; Series: GCM; Operating Temperature: -55°C ~ 125°C; Features: -; Ratings: AEC-Q200; Applications: Automotive; Failure Rate: -; Mounting Type: Surface Mount, MLCC; Size: 1.00mm x 0.50mm; Height: -; Thickness: 0.55mm; Category: Capacitor; Value: 82nF
footprint CC0402
pins: 1, 2

## CC-82pF-0402-50V-±5%
designator C?, comment Voltage - Rated: 50V  Package: 0402  (hidden comment: 82pF)
CAP CER 82PF 50V C0G/NP0 0402; Manufacturer Part Number: GCM1555C1H820JA16D; Manufacturer: Murata Electronics; Tolerance: ±5%; Temperature Coefficient: C0G; Object  Type: Part; Design Item ID: CC-82pF-0402-50V-±5%; Series: GCM; Operating Temperature: -55°C ~ 125°C; Features: -; Ratings: AEC-Q200; Applications: Automotive; Failure Rate: -; Mounting Type: Surface Mount, MLCC; Size: 1.00mm x 0.50mm; Height: -; Thickness: 0.55mm; Category: Capacitor; Value: 82pF
footprint CC0402
pins: 1, 2

## CC-82pF-0603-100V-±1%
designator C?, comment Voltage - Rated: 100V  Package: 0603  (hidden comment: 82pF)
CAP CER 82PF 100V C0G/NP0 0603; Manufacturer Part Number: GCM1885C2A820FA16D; Manufacturer: Murata Electronics; Tolerance: ±1%; Temperature Coefficient: C0G; Object  Type: Part; Design Item ID: CC-82pF-0603-100V-±1%; Series: GCM; Operating Temperature: -55°C ~ 125°C; Features: -; Ratings: AEC-Q200; Applications: Automotive; Failure Rate: -; Mounting Type: Surface Mount, MLCC; Size: 1.60mm x 0.80mm; Height: -; Thickness: 0.90mm; Category: Capacitor; Value: 82pF
footprint CC0603
pins: 1, 2

## CC-91pF-0402-50V-±1%
designator C?, comment Voltage - Rated: 50V  Package: 0402  (hidden comment: 91pF)
CAP CER 91PF 50V C0G/NP0 0402; Manufacturer Part Number: GCM1555C1H910FA16D; Manufacturer: Murata Electronics; Tolerance: ±1%; Temperature Coefficient: C0G; Object  Type: Part; Design Item ID: CC-91pF-0402-50V-±1%; Series: GCM; Operating Temperature: -55°C ~ 125°C; Features: -; Ratings: AEC-Q200; Applications: Automotive; Failure Rate: -; Mounting Type: Surface Mount, MLCC; Size: 1.00mm x 0.50mm; Height: -; Thickness: 0.55mm; Category: Capacitor; Value: 91pF
footprint CC0402
pins: 1, 2

## CC-100nF-0402-16V-±10%
designator C?, comment Voltage - Rated: 16V  Package: 0402  (hidden comment: 100nF)
CAP CER 0.1UF 16V X7R 0402; Manufacturer Part Number: GCM155R71C104KA55D; Manufacturer: Murata Electronics; Tolerance: ±10%; Temperature Coefficient: C0G; Object  Type: Part; Design Item ID: CC-100nF-0402-16V-±10%; Series: GCM; Operating Temperature: -55°C ~ 125°C; Features: -; Ratings: AEC-Q200; Applications: Automotive; Failure Rate: -; Mounting Type: Surface Mount, MLCC; Size: 1.00mm x 0.50mm; Height: -; Thickness: 0.55mm; Category: Capacitor; Value: 100nF
footprint CC0402
pins: 1, 2

## CC-100nF-0402-50V-±10%
designator C?, comment Voltage - Rated: 50V  Package: 0402  (hidden comment: 100nF)
CAP CER 0.1UF 50V X7R 0402; Manufacturer Part Number: GCM155R71H104KE02D; Manufacturer: Murata Electronics; Tolerance: ±10%; Temperature Coefficient: C0G; Object  Type: Part; Design Item ID: CC-100nF-0402-50V-±10%; Series: GCM; Operating Temperature: -55°C ~ 125°C; Features: -; Ratings: AEC-Q200; Applications: Automotive; Failure Rate: -; Mounting Type: Surface Mount, MLCC; Size: 1.00mm x 0.50mm; Height: -; Thickness: 0.55mm; Category: Capacitor; Value: 100nF
footprint CC0402
pins: 1, 2

## CC-100nF-0603-50V-±10%
designator C?, comment Voltage - Rated: 50V  Package: 0603  (hidden comment: 100nF)
CAP CER 0.1UF 50V X8L 0603; Manufacturer Part Number: GCM188L81H104KA57D; Manufacturer: Murata Electronics; Tolerance: ±10%; Object  Type: Part; Design Item ID: CC-100nF-0603-50V-±10%; Series: GCM; Temperature Coefficient: X8L; Operating Temperature: -55°C ~ 125°C; Features: -; Ratings: AEC-Q200; Applications: Automotive; Failure Rate: -; Mounting Type: Surface Mount, MLCC; Size: 1.60mm x 0.80mm; Height: -; Thickness: 0.90mm; Category: Capacitor; Value: 100nF
footprint CC0603
pins: 1, 2

## CC-100pF-0402-50V-±1%
designator C?, comment Voltage - Rated: 50V  Package: 0402  (hidden comment: 100pF)
CAP CER 100PF 50V C0G/NP0 0402; Manufacturer Part Number: GCM1555C1H101FA16D; Manufacturer: Murata Electronics; Tolerance: ±1%; Temperature Coefficient: C0G; Object  Type: Part; Design Item ID: CC-100pF-0402-50V-±1%; Series: GCM; Operating Temperature: -55°C ~ 125°C; Features: -; Ratings: AEC-Q200; Applications: Automotive; Failure Rate: -; Mounting Type: Surface Mount, MLCC; Size: 1.00mm x 0.50mm; Height: -; Thickness: 0.55mm; Category: Capacitor; Value: 100pF
footprint CC0402
pins: 1, 2

## CC-100pF-0603-100V-±1%
designator C?, comment Voltage - Rated: 100V  Package: 0603  (hidden comment: 100pF)
CAP CER 100PF 100V C0G/NP0 0603; Manufacturer Part Number: GCM1885C2A101FA16D; Manufacturer: Murata Electronics; Tolerance: ±1%; Temperature Coefficient: C0G; Object  Type: Part; Design Item ID: CC-100pF-0603-100V-±1%; Series: GCM; Operating Temperature: -55°C ~ 125°C; Features: -; Ratings: AEC-Q200; Applications: Automotive; Failure Rate: -; Mounting Type: Surface Mount, MLCC; Size: 1.60mm x 0.80mm; Height: -; Thickness: 0.90mm; Category: Capacitor; Value: 100pF
footprint CC0603
pins: 1, 2

## CC-110pF-0402-50V-±1%
designator C?, comment Voltage - Rated: 50V  Package: 0402  (hidden comment: 110pF)
CAP CER 110PF 50V C0G/NP0 0402; Manufacturer Part Number: GCM1555C1H111FA16D; Manufacturer: Murata Electronics; Tolerance: ±1%; Temperature Coefficient: C0G; Object  Type: Part; Design Item ID: CC-110pF-0402-50V-±1%; Series: GCM; Operating Temperature: -55°C ~ 125°C; Features: -; Ratings: AEC-Q200; Applications: Automotive; Failure Rate: -; Mounting Type: Surface Mount, MLCC; Size: 1.00mm x 0.50mm; Height: -; Thickness: 0.55mm; Category: Capacitor; Value: 110pF
footprint CC0402
pins: 1, 2

## CC-120pF-0402-50V-±1%
designator C?, comment Voltage - Rated: 50V  Package: 0402  (hidden comment: 120pF)
CAP CER 120PF 50V C0G/NP0 0402; Manufacturer Part Number: GCM1555C1H121FA16D; Manufacturer: Murata Electronics; Tolerance: ±1%; Temperature Coefficient: C0G; Object  Type: Part; Design Item ID: CC-120pF-0402-50V-±1%; Series: GCM; Operating Temperature: -55°C ~ 125°C; Features: -; Ratings: AEC-Q200; Applications: Automotive; Failure Rate: -; Mounting Type: Surface Mount, MLCC; Size: 1.00mm x 0.50mm; Height: -; Thickness: 0.55mm; Category: Capacitor; Value: 120pF
footprint CC0402
pins: 1, 2

## CC-120pF-0402-50V-±5%
designator C?, comment Voltage - Rated: 50V  Package: 0402  (hidden comment: 120pF)
CAP CER 120PF 50V C0G/NP0 0402; Manufacturer Part Number: GCM1555C1H121JA16D; Manufacturer: Murata Electronics; Tolerance: ±5%; Temperature Coefficient: C0G; Object  Type: Part; Design Item ID: CC-120pF-0402-50V-±5%; Series: GCM; Operating Temperature: -55°C ~ 125°C; Features: -; Ratings: AEC-Q200; Applications: Automotive; Failure Rate: -; Mounting Type: Surface Mount, MLCC; Size: 1.00mm x 0.50mm; Height: -; Thickness: 0.55mm; Category: Capacitor; Value: 120pF
footprint CC0402
pins: 1, 2

## CC-120pF-0603-100V-±1%
designator C?, comment Voltage - Rated: 100V  Package: 0603  (hidden comment: 120pF)
CAP CER 120PF 100V C0G/NP0 0603; Manufacturer Part Number: GCM1885C2A121FA16D; Manufacturer: Murata Electronics; Tolerance: ±1%; Temperature Coefficient: C0G; Object  Type: Part; Design Item ID: CC-120pF-0603-100V-±1%; Series: GCM; Operating Temperature: -55°C ~ 125°C; Features: -; Ratings: AEC-Q200; Applications: Automotive; Failure Rate: -; Mounting Type: Surface Mount, MLCC; Size: 1.60mm x 0.80mm; Height: -; Thickness: 0.90mm; Category: Capacitor; Value: 120pF
footprint CC0603
pins: 1, 2

## CC-150nF-0603-50V-±10%
designator C?, comment Voltage - Rated: 50V  Package: 0603  (hidden comment: 150nF)
CAP CER 0.15UF 50V X7R 0603; Manufacturer Part Number: GCM188R71H154KA64D; Manufacturer: Murata Electronics; Tolerance: ±10%; Object  Type: Part; Design Item ID: CC-150nF-0603-50V-±10%; Series: GCM; Temperature Coefficient: X7R; Operating Temperature: -55°C ~ 125°C; Features: -; Ratings: AEC-Q200; Applications: Automotive; Failure Rate: -; Mounting Type: Surface Mount, MLCC; Size: 1.60mm x 0.80mm; Height: -; Thickness: 0.90mm; Category: Capacitor; Value: 150nF
footprint CC0603
pins: 1, 2

## CC-150pF-0402-50V-±1%
designator C?, comment Voltage - Rated: 50V  Package: 0402  (hidden comment: 150pF)
CAP CER 150PF 50V C0G/NP0 0402; Manufacturer Part Number: GCM1555C1H151FA16D; Manufacturer: Murata Electronics; Tolerance: ±1%; Temperature Coefficient: C0G; Object  Type: Part; Design Item ID: CC-150pF-0402-50V-±1%; Series: GCM; Operating Temperature: -55°C ~ 125°C; Features: -; Ratings: AEC-Q200; Applications: Automotive; Failure Rate: -; Mounting Type: Surface Mount, MLCC; Size: 1.00mm x 0.50mm; Height: -; Thickness: 0.55mm; Category: Capacitor; Value: 150pF
footprint CC0402
pins: 1, 2

## CC-150pF-0603-100V-±1%
designator C?, comment Voltage - Rated: 100V  Package: 0603  (hidden comment: 150pF)
CAP CER 150PF 100V C0G/NP0 0603; Manufacturer Part Number: GCM1885C2A151FA16D; Manufacturer: Murata Electronics; Tolerance: ±1%; Temperature Coefficient: C0G; Object  Type: Part; Design Item ID: CC-150pF-0603-100V-±1%; Series: GCM; Operating Temperature: -55°C ~ 125°C; Features: -; Ratings: AEC-Q200; Applications: Automotive; Failure Rate: -; Mounting Type: Surface Mount, MLCC; Size: 1.60mm x 0.80mm; Height: -; Thickness: 0.90mm; Category: Capacitor; Value: 150pF
footprint CC0603
pins: 1, 2